# Altium schematic symbol library Semi-ATE.SchLib: 322 symbols (part 3 of 6) (continued)
## NSBC143ZF3T5G (continued)
TRANS PREBIAS NPN 254MW SOT1123; 04. Manufacturer: ON Semiconductor; 07. Manufacturer  Part Number: NSBC143ZF3T5G; 03. Unit Price: 0.05222; 05. Quantity: 8000; 13. Created Date/Name: AUG 2018 / Hören; Design: AWGDIG; 3D-Export: No; 01. Distributor: DigiKey; 02. Distributor Part Number: NSBC143ZF3T5G-ND; 11. RoHS: YES; ComponentLink1Description: Info; ComponentLink1URL: https://www.digikey.de/products/en/discrete-semiconductor-products/transistors-bipolar-bjt-single-pre-biased/292?k=&pkeyword=&pv16=8403&sf=1&FV=mu4.7+kOhms%7C2184%2Cmu47+kOhms%7C2185%2Cffe00124%2C128002c&quantity=&ColumnSort=0&page=1&pageSize=25; ComponentLink2Description: DataSheet; ComponentLink2URL: https://www.onsemi.com/pub/Collateral/DTC143Z-D.PDF; Package: SOT-1123
footprint SOT-1123
pins: 1 Base, 2 Emitter, 3 Collector
text: 4K7; 47K

## NT
designator NT?  (value not drawn)  (net tie, no BOM)
Net Tie; 13. Created Date/Name: AUG2018/Hören; 3D-Export: No; 01. Distributor: N/A; 02. Distributor Part Number: N/A; 03. Unit Price: N/A; 04. Manufacturer: N/A; 05. Quantity: N/A; 06. Data Sheet: N/A; 07. Manufacturer  Part Number: N/A; 08. Inhouse Stock: N/A; 09. Operating Temperature: N/A; 10. Weight: N/A; 11. RoHS: N/A; 12.UL94 Flammability: N/A; ComponentLink1Description: Info; ComponentLink2Description: DataSheet
footprint NT0201 (10 mil)
footprint NT0402 (20 mil)
footprint NT0603 (40 mil)
footprint NT0805 (50 mil)
footprint NT1206 (60 mil)
footprint NT1210 (100 mil)
footprint NT (3mm Ø 1.6mm)
pins: 1, 2

## Q-OSC
designator U?, comment value 48 MHz  (hidden comment: U)
XTAL OSC XO 48.0000MHZ CMOS SMD; MFR-PN: 48.000MHz XO53050UCTB; MFR: EUROQUARTZ; 04. Manufacturer: Abracon LLC; 07. Manufacturer  Part Number: ASE-48.000MHZ-LC-T; POPULATED: yes; 03. Unit Price: 1.04; 3D-Export: No; 01. Distributor: DigiKey; 02. Distributor Part Number: 535-9576-6-ND; 09. Operating Temperature: -40°C ~ 85°C; 11. RoHS: YES
footprint XTAL5x3.2
pins: 1 En (in), 2 GND (power), 3 OUT (out), 4 VDD (power)

## Q-OSC-LVDS
designator U?, comment value 150 MHz  (hidden comment: U)
XTAL OSC 150MHZ 2.5V LVDS; MFR-PN: ALD-2-150MHz-V; MFR: ABRACON; 04. Manufacturer: Abracon LLC; 07. Manufacturer  Part Number: AX7DBF1-150.0000C; POPULATED: yes; 03. Unit Price: 6.68; 3D-Export: No; 01. Distributor: Mouser; 02. Distributor Part Number: 815-AX7DBF1-150C; 09. Operating Temperature: -40*C~85*C; 11. RoHS: YES; ComponentLink4Description: Info; ComponentLink4URL: https://www.mouser.de/ProductDetail/ABRACON/AX7DBF1-1500000C?qs=%2Fha2pyFaduiK9TUdAIPBGeIizm4hQB%252BoPFL%252BNyNXjpm9TaM4qkNWPg%3D%3D; ComponentLink5Description: DataSheet; ComponentLink5URL: https://www.mouser.de/datasheet/2/3/AX7_clearclock-1280643.pdf
footprint XTAL5x7-6 (Footprint not found)
pins: 1 En (in), 3 GND (power), 4 Q (out), 5 nQ (out), 6 VDD (power)

## Q-OSC_1
designator U?, comment NicName: 13MHz  (hidden comment: U)
XTAL OSC XO 13.0000MHZ CMOS SMD; MFR-PN: 632L3I013M00000; MFR: CTS-Frequency Controls; POPULATED: yes; 03. Unit Price: 1.81; 3D-Export: No; 04. Manufacturer: CTS-Frequency Controls; 07. Manufacturer  Part Number: 632L3I013M00000; 01. Distributor: DigiKey; 02. Distributor Part Number: CTX1233CT-ND; 09. Operating Temperature: -40°C ~ 85°C; 11. RoHS: YES; ComponentLink4Description: Info; ComponentLink4URL: https://www.digikey.de/products/en?keywords=535-9568-1-ND; ComponentLink5Description: DataSheet; ComponentLink5URL: https://abracon.com/Oscillators/ASEseries.pdf
footprint CTS-632-3.2mmx2.5mm
pins: 1 En (in), 2 GND (power), 3 OUT (out), 4 VDD (power)

## Q-OSC_2
designator U?, comment NicName: 25MHz  (hidden comment: U)
XTAL OSC XO 25.0000MHZ CMOS SMD; MFR-PN: 25.000MHz XO53050UCTB; MFR: EUROQUARTZ; 04. Manufacturer: Abracon LLC; 07. Manufacturer  Part Number: ASE-25.000MHZ-LC-T; POPULATED: yes; 03. Unit Price: 1.28; 3D-Export: No; 01. Distributor: DigiKey; 02. Distributor Part Number: 535-9568-1-ND; 09. Operating Temperature: -40°C ~ 85°C; 11. RoHS: YES; ComponentLink4Description: Info; ComponentLink4URL: https://www.digikey.de/products/en?keywords=535-9568-1-ND; ComponentLink5Description: DataSheet; ComponentLink5URL: https://abracon.com/Oscillators/ASEseries.pdf
footprint XTAL5x3.2
pins: 1 En (in), 2 GND (power), 3 OUT (out), 4 VDD (power)

## R
designator R?  value 100R  (hidden comment: R)
RES SMD 100 OHM 1% 1/16W 0402; 04. Manufacturer: Yageo; 07. Manufacturer  Part Number: RC0402FR-07100RL; 03. Unit Price: 0.09; 13. Created Date/Name: AUG2018/Hören; Voltage Rating: 50V; 3D-Export: No; Tolerance: ±1%; ComponentLink1URL: https://www.digikey.de/product-detail/en/yageo/RC0402FR-07100RL/311-100LRDKR-ND/732421; ComponentLink1Description: Info; 02. Distributor Part Number: 311-100LRDKR-ND; 09. Operating Temperature: -55°C ~ 155°C; 11. RoHS: YES; 01. Distributor: DigiKey; ComponentLink2Description: DataSheet; ComponentLink2URL: http://www.yageo.com/documents/recent/PYu-RC_Group_51_RoHS_L_10.pdf; Type: Thick Film; Power Rating: 1/16W; Temperature Range: -55°C/+125°C
simulation model RESISTOR (Resistor)
signal-integrity model Res
footprint R0201
footprint R0402 (SMT Resistor 0402)
footprint R0603 (SMT Resistor 0603)
footprint R0805 (SMT Resistor 0805)
footprint R1206 (SMT Resistor 1206)
footprint R2512
footprint TO247-2
footprint R2010W
footprint R0402 Reflow
pins: 1, 2

## R_1
designator R?, comment value 10R  (hidden comment: R)
RES SMD 10 OHM 1% 1/16W 0402; 04. Manufacturer: TE Connectivity Passive Product; 07. Manufacturer  Part Number: CRGCQ0402F10R; 03. Unit Price: 0.09; 13. Created Date/Name: AUG2018/Hören; Voltage Rating: 50V; 3D-Export: No; Tolerance: ±1%; ComponentLink1URL: https://www.digikey.de/products/en?keywords=A129603DKR-ND; ComponentLink1Description: Info; 02. Distributor Part Number: A129603DKR-ND; 09. Operating Temperature: -55°C ~ 155°C; 11. RoHS: YES; 01. Distributor: DigiKey; ComponentLink2Description: DataSheet; ComponentLink2URL: https://www.te.com/commerce/DocumentDelivery/DDEController?Action=srchrtrv&DocNm=1773204-3&DocType=DS&DocLang=English; Type: Thick Film; Power Rating: 1/16W; Temperature Range: -55°C/+125°C
simulation model RESISTOR (Resistor)
signal-integrity model Res
footprint R0201
footprint R0402 (SMT Resistor 0402)
footprint R0603 (SMT Resistor 0603)
footprint R0805 (SMT Resistor 0805)
footprint R1206 (SMT Resistor 1206)
footprint R2512
footprint TO247-2
footprint R2010W
footprint R0402 Reflow
pins: 1, 2
1 alternate drawing of the same symbol

## R_2
designator R?, comment value 10K  (hidden comment: R)
RES SMD 10K OHM 0.1% 1/16W 0402; 04. Manufacturer: Yageo; 07. Manufacturer  Part Number: RT0402BRD0710KL; 03. Unit Price: 0.35; 13. Created Date/Name: AUG2018/Hören; Power Rating: 63mW; Design: AWGDIG; 3D-Export: No; Tolerance: ±0.1%; ComponentLink1URL: https://www.digikey.de/product-detail/en/yageo/RT0402BRD0710KL/YAG1346DKR-ND/5139723; ComponentLink1Description: Info; 02. Distributor Part Number: YAG1346DKR-ND; 09. Operating Temperature: -55°C ~ 155°C; 11. RoHS: YES; 01. Distributor: DigiKey; ComponentLink2Description: DataSheet; Type: Thin Film; Package: 0402
simulation model RESISTOR (Resistor)
signal-integrity model Res
footprint R0201
footprint R0402 (SMT Resistor 0402)
footprint R0603 (SMT Resistor 0603)
footprint R0805 (SMT Resistor 0805)
footprint R1206 (SMT Resistor 1206)
footprint R2512
footprint TO247-2
footprint R0402 Reflow
pins: 1, 2
1 alternate drawing of the same symbol

## R_3
designator R?, comment value 22.5  Tolerance: ±1%  (hidden comment: R)
RES SMD 22.6 OHM 1% 1/16W 0402; 04. Manufacturer: Yageo; 07. Manufacturer  Part Number: RC0402FR-0722R6L; 03. Unit Price: 0.09; 13. Created Date/Name: AUG2018/Hören; Power Rating: 63mW; Design: AWGDIG; 3D-Export: No; ComponentLink1URL: https://www.digikey.de/product-detail/en/yageo/RC0402FR-0722R6L/311-22.6LRDKR-ND/2828234; ComponentLink1Description: Info; 02. Distributor Part Number: 311-22.6LRDKR-ND; 09. Operating Temperature: -55°C ~ 155°C; 11. RoHS: YES; 01. Distributor: DigiKey; ComponentLink2Description: DataSheet; ComponentLink2URL: http://www.yageo.com/documents/recent/PYu-RC_Group_51_RoHS_L_9.pdf; Type: Thick Film; Package: 0402
simulation model RESISTOR (Resistor)
signal-integrity model Res
footprint R0201
footprint R0402 (SMT Resistor 0402)
footprint R0603 (SMT Resistor 0603)
footprint R0805 (SMT Resistor 0805)
footprint R1206 (SMT Resistor 1206)
footprint R2512
footprint TO247-2
footprint R0402 Reflow
pins: 1, 2
1 alternate drawing of the same symbol

## R_4
designator R?, comment value 9K31  (hidden comment: R)
RES SMD 9.31KOHM 0.1% 1/16W 0402; 04. Manufacturer: Yageo; 07. Manufacturer  Part Number: RT0402BRD079K31L; 03. Unit Price: 0.37; 13. Created Date/Name: AUG2018/Hören; Power Rating: 63mW; Design: AWGDIG; 3D-Export: No; Tolerance: ±0.1%; ComponentLink1URL: https://www.digikey.de/product-detail/en/yageo/RT0402BRD079K31L/YAG4325DKR-ND/6617477; ComponentLink1Description: Info; 02. Distributor Part Number: YAG4325DKR-ND; 09. Operating Temperature: -55°C ~ 155°C; 11. RoHS: YES; 01. Distributor: DigiKey; ComponentLink2Description: DataSheet; Type: Thin Film
simulation model RESISTOR (Resistor)
signal-integrity model Res
footprint R0201
footprint R0402 (SMT Resistor 0402)
footprint R0603 (SMT Resistor 0603)
footprint R0805 (SMT Resistor 0805)
footprint R1206 (SMT Resistor 1206)
footprint R2512
footprint TO247-2
footprint R0402 Reflow
pins: 1, 2
1 alternate drawing of the same symbol

## R_5
designator R?, comment value 1K33  (hidden comment: R)
RES SMD 1.33KOHM 0.1% 1/16W 0402; 04. Manufacturer: Yageo; 07. Manufacturer  Part Number: RT0402BRD071K33L; 03. Unit Price: 0.37; 13. Created Date/Name: AUG2018/Hören; Power Rating: 63mW; Design: AWGDIG; 3D-Export: No; Tolerance: ±0.1%; ComponentLink1URL: https://www.digikey.de/product-detail/en/yageo/RT0402BRD071K33L/YAG1376DKR-ND/5139753; ComponentLink1Description: Info; 02. Distributor Part Number: YAG1376DKR-ND; 09. Operating Temperature: -55°C ~ 155°C; 11. RoHS: YES; 01. Distributor: DigiKey; ComponentLink2Description: DataSheet; ComponentLink2URL: http://www.yageo.com/documents/recent/PYu-RT_1-to-0.01_RoHS_L_9.pdf; Type: Thin Film; Package: 0402
simulation model RESISTOR (Resistor)
signal-integrity model Res
footprint R0201
footprint R0402 (SMT Resistor 0402)
footprint R0603 (SMT Resistor 0603)
footprint R0805 (SMT Resistor 0805)
footprint R1206 (SMT Resistor 1206)
footprint R2512
footprint TO247-2
footprint R0402 Reflow
pins: 1, 2
1 alternate drawing of the same symbol

## R_6
designator R?, comment value 4K7  Tolerance: ±1%  (hidden comment: R)
RES SMD 4.7K OHM 1% 1/10W 0402; 04. Manufacturer: Panasonic Electronic Components; 07. Manufacturer  Part Number: ERJ-2RKF4701X; 03. Unit Price: 0.09; 13. Created Date/Name: AUG2018/Hören; Power Rating: 100mW; Design: AWGDIG; 3D-Export: No; ComponentLink1URL: https://www.digikey.de/product-detail/en/panasonic-electronic-components/ERJ-2RKF4701X/P4.70KLDKR-ND/1747053; ComponentLink1Description: Info; 02. Distributor Part Number: P4.70KLDKR-ND; 09. Operating Temperature: -55°C ~ 155°C; 11. RoHS: YES; 01. Distributor: DigiKey; ComponentLink2Description: DataSheet; ComponentLink2URL: https://industrial.panasonic.com/cdbs/www-data/pdf/RDA0000/AOA0000C304.pdf; Package: 0402
simulation model RESISTOR (Resistor)
signal-integrity model Res
footprint R0201
footprint R0402 (SMT Resistor 0402)
footprint R0603 (SMT Resistor 0603)
footprint R0805 (SMT Resistor 0805)
footprint R1206 (SMT Resistor 1206)
footprint R2512
footprint TO247-2
footprint R0402 Reflow
pins: 1, 2
1 alternate drawing of the same symbol

## R_7
designator R?, comment value 200  Tolerance: ±0.01%  Package: 0603  (hidden comment: R)
RES 200 OHM 0.01% 1/10W 0603; 04. Manufacturer: Stackpole Electronics Inc.; 07. Manufacturer  Part Number: RNCF0603TKY200R; 03. Unit Price: 1.96; 13. Created Date/Name: AUG2018/Hören; Power Rating: 100mW; Design: AWGDIG; 3D-Export: No; ComponentLink1URL: https://www.digikey.de/products/en/resistors/chip-resistor-surface-mount/52?k=resistor&k=&pkeyword=resistor&pv7=243&sf=1&FV=c01af%2Cmu200+Ohms%7C2085%2Cffe00034%2C400005&quantity=&ColumnSort=0&page=1&pageSize=25; ComponentLink1Description: Info; 02. Distributor Part Number: RNCF0603TKY200RDKR-ND; 09. Operating Temperature: -55°C ~ 155°C; 11. RoHS: YES; 01. Distributor: DigiKey; ComponentLink2Description: DataSheet
simulation model RESISTOR (Resistor)
signal-integrity model Res
footprint R0201
footprint R0402 (SMT Resistor 0402)
footprint R0603 (SMT Resistor 0603)
footprint R0805 (SMT Resistor 0805)
footprint R1206 (SMT Resistor 1206)
footprint R2512
footprint TO247-2
footprint R0603 Reflow (SMT Resistor 0603 Reflow Soldering)
pins: 1, 2
1 alternate drawing of the same symbol

## R_8
designator R?, comment value 4M53  Tolerance: ±1%  (hidden comment: R)
RES SMD 4.53M OHM 1% 1/16W 0402; 04. Manufacturer: Vishay Dale; 07. Manufacturer  Part Number: CRCW04024M53FKED; 03. Unit Price: 0.09; 13. Created Date/Name: AUG2018/Hören; Design: AWGDIG; 3D-Export: No; ComponentLink1URL: https://www.digikey.de/product-detail/en/vishay-dale/CRCW04024M53FKED/541-4.53MLDKR-ND/1187165; ComponentLink1Description: Info; 02. Distributor Part Number: 541-4.53MLDKR-ND; 09. Operating Temperature: -55°C ~ 155°C; 11. RoHS: YES; 01. Distributor: DigiKey; ComponentLink2Description: DataSheet; ComponentLink2URL: http://www.vishay.com/docs/20035/dcrcwe3.pdf; Type: Thick Film; Package: 0402
simulation model RESISTOR (Resistor)
signal-integrity model Res
footprint R0201
footprint R0402 (SMT Resistor 0402)
footprint R0603 (SMT Resistor 0603)
footprint R0805 (SMT Resistor 0805)
footprint R1206 (SMT Resistor 1206)
footprint R2512
footprint TO247-2
footprint R0402 Reflow
pins: 1, 2
1 alternate drawing of the same symbol

## R_9
designator R?, comment value 20K  Tolerance: ±1%  (hidden comment: R)
RES SMD 20K OHM 1% 1/16W 0402; 04. Manufacturer: Yageo; 07. Manufacturer  Part Number: RC0402FR-0720KL; 03. Unit Price: 0.09; 13. Created Date/Name: AUG2018/Hören; Power Rating: 63mW; Design: AWGDIG; 3D-Export: No; ComponentLink1URL: https://www.digikey.de/product-detail/en/yageo/RC0402FR-0720KL/311-20.0KLRDKR-ND/732451; ComponentLink1Description: Info; 02. Distributor Part Number: 311-20.0KLRDKR-ND; 09. Operating Temperature: -55°C ~ 155°C; 11. RoHS: YES; 01. Distributor: DigiKey; ComponentLink2Description: DataSheet; Type: Thick Film; Package: 0402
simulation model RESISTOR (Resistor)
signal-integrity model Res
footprint R0201
footprint R0402 (SMT Resistor 0402)
footprint R0603 (SMT Resistor 0603)
footprint R0805 (SMT Resistor 0805)
footprint R1206 (SMT Resistor 1206)
footprint R2512
footprint TO247-2
footprint R0402 Reflow
pins: 1, 2
1 alternate drawing of the same symbol

## R_10
designator R?, comment value 402  Tolerance: ±1%  (hidden comment: R)
RES SMD 402 OHM 1% 1/16W 0402; 04. Manufacturer: Yageo; 07. Manufacturer  Part Number: RC0402FR-07402RL; 03. Unit Price: 0.09; 13. Created Date/Name: AUG2018/Hören; Power Rating: 63mW; Design: AWGDIG; 3D-Export: No; ComponentLink1URL: https://www.digikey.de/product-detail/en/yageo/RC0402FR-07402RL/YAG3152DKR-ND/5283023; ComponentLink1Description: Info; 02. Distributor Part Number: YAG3152DKR-ND; 09. Operating Temperature: -55°C ~ 155°C; 11. RoHS: YES; 01. Distributor: DigiKey; ComponentLink2Description: DataSheet; ComponentLink2URL: http://www.yageo.com/documents/recent/PYu-RC_Group_51_RoHS_L_9.pdf; Package: 0402
simulation model RESISTOR (Resistor)
signal-integrity model Res
footprint R0201
footprint R0402 (SMT Resistor 0402)
footprint R0603 (SMT Resistor 0603)
footprint R0805 (SMT Resistor 0805)
footprint R1206 (SMT Resistor 1206)
footprint R2512
footprint TO247-2
footprint R0402 Reflow
pins: 1, 2
1 alternate drawing of the same symbol

## R_11
designator R?, comment value 75  Tolerance: ±1%  (hidden comment: R)
RES SMD 75 OHM 1% 1/10W 0402; 04. Manufacturer: Panasonic Electronic Components; 07. Manufacturer  Part Number: ERJ-2RKF75R0X; 03. Unit Price: 0.09; 13. Created Date/Name: AUG2018/Hören; Design: AWGDIG; 3D-Export: No; ComponentLink1URL: https://www.digikey.de/product-detail/en/panasonic-electronic-components/ERJ-2RKF75R0X/P75.0LDKR-ND/575857; ComponentLink1Description: Info; 02. Distributor Part Number: P75.0LDKR-ND; 09. Operating Temperature: -55°C ~ 155°C; 11. RoHS: YES; 01. Distributor: DigiKey; ComponentLink2Description: DataSheet; ComponentLink2URL: https://industrial.panasonic.com/cdbs/www-data/pdf/RDA0000/AOA0000C304.pdf; Package: 0402
simulation model RESISTOR (Resistor)
signal-integrity model Res
footprint R0201
footprint R0402 (SMT Resistor 0402)
footprint R0603 (SMT Resistor 0603)
footprint R0805 (SMT Resistor 0805)
footprint R1206 (SMT Resistor 1206)
footprint R2512
footprint TO247-2
footprint R0402 Reflow
pins: 1, 2
1 alternate drawing of the same symbol

## R_12
designator R?, comment value 3K3  Tolerance: ±1%  (hidden comment: R)
RES SMD 3.3K OHM 1% 1/16W 0402; 04. Manufacturer: Yageo; 07. Manufacturer  Part Number: RC0402FR-073K3L; 03. Unit Price: 0.09; 13. Created Date/Name: AUG2018/Hören; Design: AWGDIG; 3D-Export: No; ComponentLink1URL: https://www.digikey.de/product-detail/en/yageo/RC0402FR-073K3L/311-3.30KLRDKR-ND/732474; ComponentLink1Description: Info; 02. Distributor Part Number: 311-3.30KLRDKR-ND; 09. Operating Temperature: -55°C ~ 155°C; 11. RoHS: YES; 01. Distributor: DigiKey; ComponentLink2Description: DataSheet; ComponentLink2URL: http://www.yageo.com/documents/recent/PYu-RC_Group_51_RoHS_L_9.pdf; Package: 0402
simulation model RESISTOR (Resistor)
signal-integrity model Res
footprint R0201
footprint R0402 (SMT Resistor 0402)
footprint R0603 (SMT Resistor 0603)
footprint R0805 (SMT Resistor 0805)
footprint R1206 (SMT Resistor 1206)
footprint R2512
footprint TO247-2
footprint R0402 Reflow
pins: 1, 2
1 alternate drawing of the same symbol

## R_13
designator R?, comment value 82K  Tolerance: ±1%  Package: 0402  (hidden comment: R)
RES SMD 82K OHM 1% 1/16W 0402; 04. Manufacturer: Yageo; 07. Manufacturer  Part Number: RC0402FR-0782KL; 03. Unit Price: 0.09; 13. Created Date/Name: AUG2018/Hören; Design: AWGDIG; 3D-Export: No; ComponentLink1URL: https://www.digikey.de/product-detail/en/yageo/RC0402FR-0782KL/311-82.0KLRCT-ND/729612; ComponentLink1Description: Info; 02. Distributor Part Number: 311-82.0KLRCT-ND; 09. Operating Temperature: -55°C ~ 155°C; 11. RoHS: YES; 01. Distributor: DigiKey; ComponentLink2Description: DataSheet; ComponentLink2URL: http://www.yageo.com/documents/recent/PYu-RC_Group_51_RoHS_L_9.pdf
simulation model RESISTOR (Resistor)
signal-integrity model Res
footprint R0201
footprint R0402 (SMT Resistor 0402)
footprint R0603 (SMT Resistor 0603)
footprint R0805 (SMT Resistor 0805)
footprint R1206 (SMT Resistor 1206)
footprint R2512
footprint TO247-2
footprint R0402 Reflow
pins: 1, 2
1 alternate drawing of the same symbol

## R_14
designator R?, comment value 1M15  Tolerance: ±1%  (hidden comment: R)
RES 1.15M OHM 1% 1/16W 0402; 04. Manufacturer: Stackpole Electronics Inc.; 07. Manufacturer  Part Number: RMCF0402FT1M15; 03. Unit Price: 0.09; 13. Created Date/Name: AUG2018/Hören; Power Rating: 63mW; TC: ±200ppm/°C; Design: AWGDIG; 3D-Export: No; ComponentLink1URL: https://www.digikey.de/product-detail/en/stackpole-electronics-inc/RMCF0402FT1M15/RMCF0402FT1M15CT-ND/7790649; ComponentLink1Description: Info; 02. Distributor Part Number: RMCF0402FT1M15CT-ND; 09. Operating Temperature: -55°C ~ 155°C; 11. RoHS: YES; 01. Distributor: DigiKey; ComponentLink2Description: DataSheet; ComponentLink2URL: https://www.seielect.com/Catalog/SEI-RMCF_RMCP.pdf; Package: 0402
simulation model RESISTOR (Resistor)
signal-integrity model Res
footprint R0201
footprint R0402 (SMT Resistor 0402)
footprint R0603 (SMT Resistor 0603)
footprint R0805 (SMT Resistor 0805)
footprint R1206 (SMT Resistor 1206)
footprint R2512
footprint TO247-2
footprint R0402 Reflow
pins: 1, 2
1 alternate drawing of the same symbol

## R_15
designator R?, comment value 50  (hidden comment: R)
RES SMD 50 OHM 0.1% 1/20W 0402; 04. Manufacturer: Vishay Thin Film; 07. Manufacturer  Part Number: FC0402E50R0BST1; 03. Unit Price: 2.1; 13. Created Date/Name: AUG2018/Hören; Power Rating: 50mW; Design: AWGDIG; 3D-Export: No; Tolerance: ±0.1%; ComponentLink1URL: https://www.digikey.de/product-detail/en/vishay-thin-film/FC0402E50R0BST1/FC0402-50BWDKR-ND/1769804; ComponentLink1Description: Info; 02. Distributor Part Number: FC0402-50BWDKR-ND; 09. Operating Temperature: -55°C ~ 155°C; 11. RoHS: YES; 01. Distributor: DigiKey; ComponentLink2Description: DataSheet; ComponentLink2URL: http://www.vishay.com/docs/60093/fcseries.pdf; Type: Thin Film; Package: 0402
simulation model RESISTOR (Resistor)
signal-integrity model Res
footprint R0201
footprint R0402 (SMT Resistor 0402)
footprint R0603 (SMT Resistor 0603)
footprint R0805 (SMT Resistor 0805)
footprint R1206 (SMT Resistor 1206)
footprint R2512
footprint TO247-2
footprint R0402 Reflow
pins: 1, 2
1 alternate drawing of the same symbol

## R_16
designator R?, comment value 75K  (hidden comment: R)
RES SMD 75K OHM 0.1% 1/16W 0402; 04. Manufacturer: Yageo; 07. Manufacturer  Part Number: RT0402BRD0775KL; 03. Unit Price: 0.37; 13. Created Date/Name: AUG2018/Hören; Design: AWGDIG; 3D-Export: No; Tolerance: ±0.1%; ComponentLink1URL: https://www.digikey.de/product-detail/en/yageo/RT0402BRD0775KL/YAG4307DKR-ND/6617459; ComponentLink1Description: Info; 02. Distributor Part Number: YAG4307DKR-ND; 09. Operating Temperature: -55°C ~ 155°C; 11. RoHS: YES; 01. Distributor: DigiKey; ComponentLink2Description: DataSheet; ComponentLink2URL: http://www.yageo.com/documents/recent/PYu-RT_1-to-0.01_RoHS_L_9.pdf; Package: 0402
simulation model RESISTOR (Resistor)
signal-integrity model Res
footprint R0201
footprint R0402 (SMT Resistor 0402)
footprint R0603 (SMT Resistor 0603)
footprint R0805 (SMT Resistor 0805)
footprint R1206 (SMT Resistor 1206)
footprint R2512
footprint TO247-2
footprint R0402 Reflow
pins: 1, 2
1 alternate drawing of the same symbol

## R_17
designator R?, comment value 13K  (hidden comment: R)
RES SMD 13K OHM 0.1% 1/16W 0402; 04. Manufacturer: Yageo; 07. Manufacturer  Part Number: RT0402BRD0713KL; 03. Unit Price: 0.37; 13. Created Date/Name: AUG2018/Hören; Power Rating: 63mW; Design: AWGDIG; 3D-Export: No; Tolerance: ±0.1%; ComponentLink1URL: https://www.digikey.de/product-detail/en/yageo/RT0402BRD0713KL/YAG1357DKR-ND/5139734; ComponentLink1Description: Info; 02. Distributor Part Number: YAG1357DKR-ND; 09. Operating Temperature: -55°C ~ 155°C; 11. RoHS: YES; 01. Distributor: DigiKey; ComponentLink2Description: DataSheet; ComponentLink2URL: http://www.yageo.com/documents/recent/PYu-RT_1-to-0.01_RoHS_L_9.pdf; Type: Thin Film; Package: 0402
simulation model RESISTOR (Resistor)
signal-integrity model Res
footprint R0201
footprint R0402 (SMT Resistor 0402)
footprint R0603 (SMT Resistor 0603)
footprint R0805 (SMT Resistor 0805)
footprint R1206 (SMT Resistor 1206)
footprint R2512
footprint TO247-2
footprint R0402 Reflow
pins: 1, 2
1 alternate drawing of the same symbol

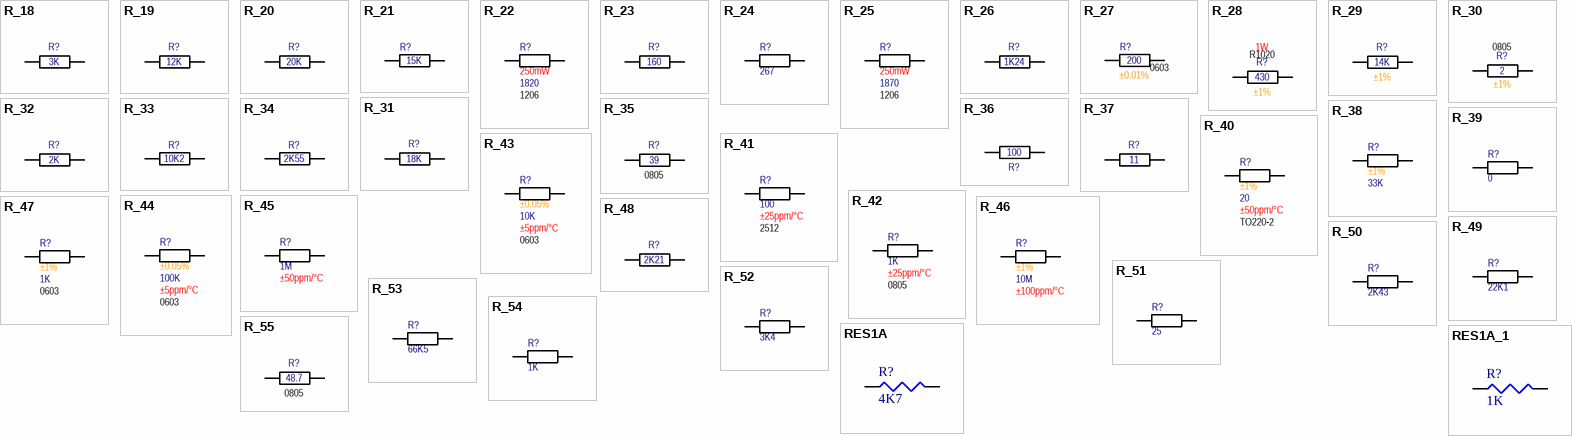
[diagram p11: symbols R_18 to RES1A_1]

## R_18
designator R?, comment value 3K  (hidden comment: R)
RES SMD 3K OHM 0.1% 1/16W 0402; 04. Manufacturer: Yageo; 07. Manufacturer  Part Number: RT0402BRD073KL; 03. Unit Price: 0.37; 13. Created Date/Name: AUG2018/Hören; Power Rating: 63mW; Design: AWGDIG; 3D-Export: No; Tolerance: ±0.1%; ComponentLink1URL: https://www.digikey.de/product-detail/en/yageo/RT0402BRD073KL/YAG1428DKR-ND/5139805; ComponentLink1Description: Info; 02. Distributor Part Number: YAG1428DKR-ND; 09. Operating Temperature: -55°C ~ 155°C; 11. RoHS: YES; 01. Distributor: DigiKey; ComponentLink2Description: DataSheet; ComponentLink2URL: http://www.yageo.com/documents/recent/PYu-RT_1-to-0.01_RoHS_L_9.pdf; Type: Thin Film; Package: 0402
simulation model RESISTOR (Resistor)
signal-integrity model Res
footprint R0201
footprint R0402 (SMT Resistor 0402)
footprint R0603 (SMT Resistor 0603)
footprint R0805 (SMT Resistor 0805)
footprint R1206 (SMT Resistor 1206)
footprint R2512
footprint TO247-2
footprint R0402 Reflow
pins: 1, 2
1 alternate drawing of the same symbol

## R_19
designator R?, comment value 12K  (hidden comment: R)
RES SMD 12K OHM 0.1% 1/16W 0402; 04. Manufacturer: Yageo; 07. Manufacturer  Part Number: RT0402BRE0712KL; 03. Unit Price: 0.37; 13. Created Date/Name: AUG2018/Hören; Power Rating: 63mW; Design: AWGDIG; 3D-Export: No; Tolerance: ±0.1%; ComponentLink1URL: https://www.digikey.de/product-detail/en/yageo/RT0402BRE0712KL/YAG4339DKR-ND/6617491; ComponentLink1Description: Info; 02. Distributor Part Number: YAG4339DKR-ND; 09. Operating Temperature: -55°C ~ 155°C; 11. RoHS: YES; 01. Distributor: DigiKey; ComponentLink2Description: DataSheet; ComponentLink2URL: http://www.yageo.com/documents/recent/PYu-RT_1-to-0.01_RoHS_L_9.pdf; Type: Thin Film; Package: 0402
simulation model RESISTOR (Resistor)
signal-integrity model Res
footprint R0201
footprint R0402 (SMT Resistor 0402)
footprint R0603 (SMT Resistor 0603)
footprint R0805 (SMT Resistor 0805)
footprint R1206 (SMT Resistor 1206)
footprint R2512
footprint TO247-2
footprint R0402 Reflow
pins: 1, 2
1 alternate drawing of the same symbol

## R_20
designator R?, comment value 20K  (hidden comment: R)
RES SMD 20K OHM 0.1% 1/16W 0402; 04. Manufacturer: Yageo; 07. Manufacturer  Part Number: RT0402BRD0720KL; 03. Unit Price: 0.37; 13. Created Date/Name: AUG2018/Hören; Power Rating: 63mW; Design: AWGDIG; 3D-Export: No; Tolerance: ±0.1%; ComponentLink1URL: https://www.digikey.de/product-detail/en/yageo/RT0402BRD0720KL/YAG1388DKR-ND/5139765; ComponentLink1Description: Info; 02. Distributor Part Number: YAG1388DKR-ND; 09. Operating Temperature: -55°C ~ 155°C; 11. RoHS: YES; 01. Distributor: DigiKey; ComponentLink2Description: DataSheet; Type: Thin Film; Package: 0402
simulation model RESISTOR (Resistor)
signal-integrity model Res
footprint R0201
footprint R0402 (SMT Resistor 0402)
footprint R0603 (SMT Resistor 0603)
footprint R0805 (SMT Resistor 0805)
footprint R1206 (SMT Resistor 1206)
footprint R2512
footprint TO247-2
footprint R0402 Reflow
pins: 1, 2
1 alternate drawing of the same symbol

## R_21
designator R?, comment value 15K  (hidden comment: R)
RES SMD 15K OHM 0.1% 1/16W 0402; 04. Manufacturer: Susumu; 07. Manufacturer  Part Number: RG1005P-153-B-T5; Tolerance: -55°C ~ 155°C; 03. Unit Price: 0.37; 13. Created Date/Name: AUG2018/Hören; Power Rating: 63mW; Design: AWGDIG; 3D-Export: No; ComponentLink1URL: https://www.digikey.de/product-detail/en/susumu/RG1005P-153-B-T5/RG10P15KBDKR-ND/1783711; ComponentLink1Description: Info; 02. Distributor Part Number: RG10P15KBDKR-ND; 09. Operating Temperature: -55°C ~ 155°C; 11. RoHS: YES; 01. Distributor: DigiKey; ComponentLink2Description: DataSheet; Type: Thin Film; Package: 0402
simulation model RESISTOR (Resistor)
signal-integrity model Res
footprint R0201
footprint R0402 (SMT Resistor 0402)
footprint R0603 (SMT Resistor 0603)
footprint R0805 (SMT Resistor 0805)
footprint R1206 (SMT Resistor 1206)
footprint R2512
footprint TO247-2
footprint R0402 Reflow
pins: 1, 2
1 alternate drawing of the same symbol